# Altium schematic symbol library Diodes - TVS.SchLib: 5379 symbols (part 34 of 35) (continued)
## VESD01-02V-G-08 (continued)
TVS DIODE 1V 9V SOD523; Manufacturer: Vishay Semiconductor Diodes Division; Capacitance @ Frequency: 180pF @ 1MHz; Current - Peak Pulse (10/1000µs): 7A (8/20µs); Power Line Protection: No; Power - Peak Pulse: 63W; Type: Zener; Unidirectional Channels: 1; Voltage - Breakdown (Min): 1.5V; Voltage - Clamping (Max) @ Ipp: 9V (Typ); Voltage - Reverse Standoff (Typ): 1V (Max); Part Number: VESD01-02V-G-08; Applications: General Purpose; ComponentLink1Description: Datasheet; ComponentLink1URL: https://www.vishay.com/docs/83367/vesdxx02v.pdf; ComponentLink2Description: DigiKey Link; ComponentLink2URL: http://digikey.com/product-detail/en/vishay-semiconductor-diodes-division/VESD01-02V-G-08/VESD01-02V-G-08CT-ND/2658775; LastUpdated: 9/2/2020 1:28:24 AM; Lifecycle Status: Active; Minimum Order: 1; Mounting Type: Surface Mount; Operating Temperature: -40°C ~ 125°C (TJ); Package / Case: SC-79, SOD-523; Packaging: TapeAndReel; PartId: 9733; Part Status: Active; Price: 0.08; Series: -; Supplier 1: DigiKey; Supplier Part Number 1: VESD01-02V-G-08CT-ND; Supplier Device Package: SOD-523
footprint SOD523F
pins: 1, 2

## VESD01C1-02V-G3-08
designator D?
ESD PROTECTION DIODE SOD-523; Manufacturer: Vishay Semiconductor Diodes Division; Capacitance @ Frequency: 192pF @ 1MHz; Current - Peak Pulse (10/1000µs): 14.6A (8/20µs); Power Line Protection: No; Power - Peak Pulse: 100W; Type: Zener; Unidirectional Channels: 1; Voltage - Breakdown (Min): 2.5V; Voltage - Clamping (Max) @ Ipp: 6.9V; Voltage - Reverse Standoff (Typ): 1V (Max); Part Number: VESD01C1-02V-G3-08; Applications: Automotive; ComponentLink1Description: Datasheet; ComponentLink1URL: http://www.vishay.com/docs/86130/vesd01c1-02vtovesd33c1-02v.pdf; ComponentLink2Description: DigiKey Link; ComponentLink2URL: http://digikey.com/product-detail/en/vishay-semiconductor-diodes-division/VESD01C1-02V-G3-08/VESD01C1-02V-G3-08GICT-ND/9948014; LastUpdated: 9/2/2020 1:28:24 AM; Lifecycle Status: Active; Minimum Order: 1; Mounting Type: Surface Mount; Operating Temperature: -55°C ~ 150°C (TJ); Package / Case: SC-79, SOD-523; Packaging: TapeAndReel; PartId: 9729; Part Status: Active; Price: 0.06; Series: Automotive, AEC-Q101; Supplier 1: DigiKey; Supplier Part Number 1: VESD01C1-02V-G3-08GICT-ND; Supplier Device Package: SOD-523
footprint SOD523F
pins: 1, 2

## VESD01C1-02VHG3-08
designator D?
ESD PROTECTION DIODE SOD-523; Manufacturer: Vishay Semiconductor Diodes Division; Capacitance @ Frequency: 192pF @ 1MHz; Current - Peak Pulse (10/1000µs): 14.6A (8/20µs); Power Line Protection: No; Power - Peak Pulse: 100W; Type: Zener; Unidirectional Channels: 1; Voltage - Breakdown (Min): 2.5V; Voltage - Clamping (Max) @ Ipp: 6.9V; Voltage - Reverse Standoff (Typ): 1V (Max); Part Number: VESD01C1-02VHG3-08; Applications: Automotive; ComponentLink1Description: Datasheet; ComponentLink1URL: http://www.vishay.com/docs/86130/vesd01c1-02vtovesd33c1-02v.pdf; ComponentLink2Description: DigiKey Link; ComponentLink2URL: http://digikey.com/product-detail/en/vishay-semiconductor-diodes-division/VESD01C1-02VHG3-08/VESD01C1-02VHG3-08GICT-ND/9948024; LastUpdated: 9/2/2020 1:28:24 AM; Lifecycle Status: Active; Minimum Order: 1; Mounting Type: Surface Mount; Operating Temperature: -55°C ~ 150°C (TJ); Package / Case: SC-79, SOD-523; Packaging: TapeAndReel; PartId: 9736; Part Status: Active; Price: 0.06; Series: Automotive, AEC-Q101; Supplier 1: DigiKey; Supplier Part Number 1: VESD01C1-02VHG3-08GICT-ND; Supplier Device Package: SOD-523
footprint SOD523F
pins: 1, 2

## VESD03-02V-G-08
designator D?
TVS DIODE 3V 12V SOD523; Manufacturer: Vishay Semiconductor Diodes Division; Capacitance @ Frequency: 110pF @ 1MHz; Current - Peak Pulse (10/1000µs): 9A (8/20µs); Power Line Protection: No; Power - Peak Pulse: 108W; Type: Zener; Unidirectional Channels: 1; Voltage - Breakdown (Min): 4V; Voltage - Clamping (Max) @ Ipp: 12V (Typ); Voltage - Reverse Standoff (Typ): 3V (Max); Part Number: VESD03-02V-G-08; Applications: General Purpose; ComponentLink1Description: Datasheet; ComponentLink1URL: https://www.vishay.com/docs/83367/vesdxx02v.pdf; ComponentLink2Description: DigiKey Link; ComponentLink2URL: http://digikey.com/product-detail/en/vishay-semiconductor-diodes-division/VESD03-02V-G-08/VESD03-02V-G-08CT-ND/2658774; LastUpdated: 9/2/2020 1:28:24 AM; Lifecycle Status: Active; Minimum Order: 1; Mounting Type: Surface Mount; Operating Temperature: -40°C ~ 125°C (TJ); Package / Case: SC-79, SOD-523; Packaging: TapeAndReel; PartId: 9749; Part Status: Active; Price: 0.08; Series: -; Supplier 1: DigiKey; Supplier Part Number 1: VESD03-02V-G-08CT-ND; Supplier Device Package: SOD-523
footprint SOD523F
pins: 1, 2

## VESD03C1-02V-G3-08
designator D?
ESD PROTECTION DIODE SOD-523; Manufacturer: Vishay Semiconductor Diodes Division; Capacitance @ Frequency: 112pF @ 1MHz; Current - Peak Pulse (10/1000µs): 11.6A (8/20µs); Power Line Protection: No; Power - Peak Pulse: 100W; Type: Zener; Unidirectional Channels: 1; Voltage - Breakdown (Min): 4.4V; Voltage - Clamping (Max) @ Ipp: 8.7V; Voltage - Reverse Standoff (Typ): 3V (Max); Part Number: VESD03C1-02V-G3-08; Applications: Automotive; ComponentLink1Description: Datasheet; ComponentLink1URL: http://www.vishay.com/docs/86130/vesd01c1-02vtovesd33c1-02v.pdf; ComponentLink2Description: DigiKey Link; ComponentLink2URL: http://digikey.com/product-detail/en/vishay-semiconductor-diodes-division/VESD03C1-02V-G3-08/VESD03C1-02V-G3-08GICT-ND/9948015; LastUpdated: 9/2/2020 1:28:23 AM; Lifecycle Status: Active; Minimum Order: 1; Mounting Type: Surface Mount; Operating Temperature: -55°C ~ 150°C (TJ); Package / Case: SC-79, SOD-523; Packaging: TapeAndReel; PartId: 9725; Part Status: Active; Price: 0.06; Series: Automotive, AEC-Q101; Supplier 1: DigiKey; Supplier Part Number 1: VESD03C1-02V-G3-08GICT-ND; Supplier Device Package: SOD-523
footprint SOD523F
pins: 1, 2

## VESD03C1-02VHG3-08
designator D?
ESD PROTECTION DIODE SOD-523; Manufacturer: Vishay Semiconductor Diodes Division; Capacitance @ Frequency: 112pF @ 1MHz; Current - Peak Pulse (10/1000µs): 11.6A (8/20µs); Power Line Protection: No; Power - Peak Pulse: 100W; Type: Zener; Unidirectional Channels: 1; Voltage - Breakdown (Min): 4.4V; Voltage - Clamping (Max) @ Ipp: 8.7V; Voltage - Reverse Standoff (Typ): 3V (Max); Part Number: VESD03C1-02VHG3-08; Applications: Automotive; ComponentLink1Description: Datasheet; ComponentLink1URL: http://www.vishay.com/docs/86130/vesd01c1-02vtovesd33c1-02v.pdf; ComponentLink2Description: DigiKey Link; ComponentLink2URL: http://digikey.com/product-detail/en/vishay-semiconductor-diodes-division/VESD03C1-02VHG3-08/VESD03C1-02VHG3-08GICT-ND/9948025; LastUpdated: 9/2/2020 1:28:24 AM; Lifecycle Status: Active; Minimum Order: 1; Mounting Type: Surface Mount; Operating Temperature: -55°C ~ 150°C (TJ); Package / Case: SC-79, SOD-523; Packaging: TapeAndReel; PartId: 9800; Part Status: Active; Price: 0.06; Series: Automotive, AEC-Q101; Supplier 1: DigiKey; Supplier Part Number 1: VESD03C1-02VHG3-08GICT-ND; Supplier Device Package: SOD-523
footprint SOD523F
pins: 1, 2

## VESD05-02V-G-08
designator D?
TVS DIODE 5V 20V SOD523; Manufacturer: Vishay Semiconductor Diodes Division; Capacitance @ Frequency: 55pF @ 1MHz; Current - Peak Pulse (10/1000µs): 6A (8/20µs); Power Line Protection: No; Power - Peak Pulse: 120W; Type: Zener; Unidirectional Channels: 1; Voltage - Breakdown (Min): 6.5V; Voltage - Clamping (Max) @ Ipp: 20V (Typ); Voltage - Reverse Standoff (Typ): 5V (Max); Part Number: VESD05-02V-G-08; Applications: General Purpose; ComponentLink1Description: Datasheet; ComponentLink1URL: https://www.vishay.com/docs/83367/vesdxx02v.pdf; ComponentLink2Description: DigiKey Link; ComponentLink2URL: http://digikey.com/product-detail/en/vishay-semiconductor-diodes-division/VESD05-02V-G-08/VESD05-02V-G-08CT-ND/2658773; LastUpdated: 9/2/2020 1:28:24 AM; Lifecycle Status: Active; Minimum Order: 1; Mounting Type: Surface Mount; Operating Temperature: -40°C ~ 125°C (TJ); Package / Case: SC-79, SOD-523; Packaging: TapeAndReel; PartId: 9771; Part Status: Active; Price: 0.08; Series: -; Supplier 1: DigiKey; Supplier Part Number 1: VESD05-02V-G-08CT-ND; Supplier Device Package: SOD-523
footprint SOD523F
pins: 1, 2

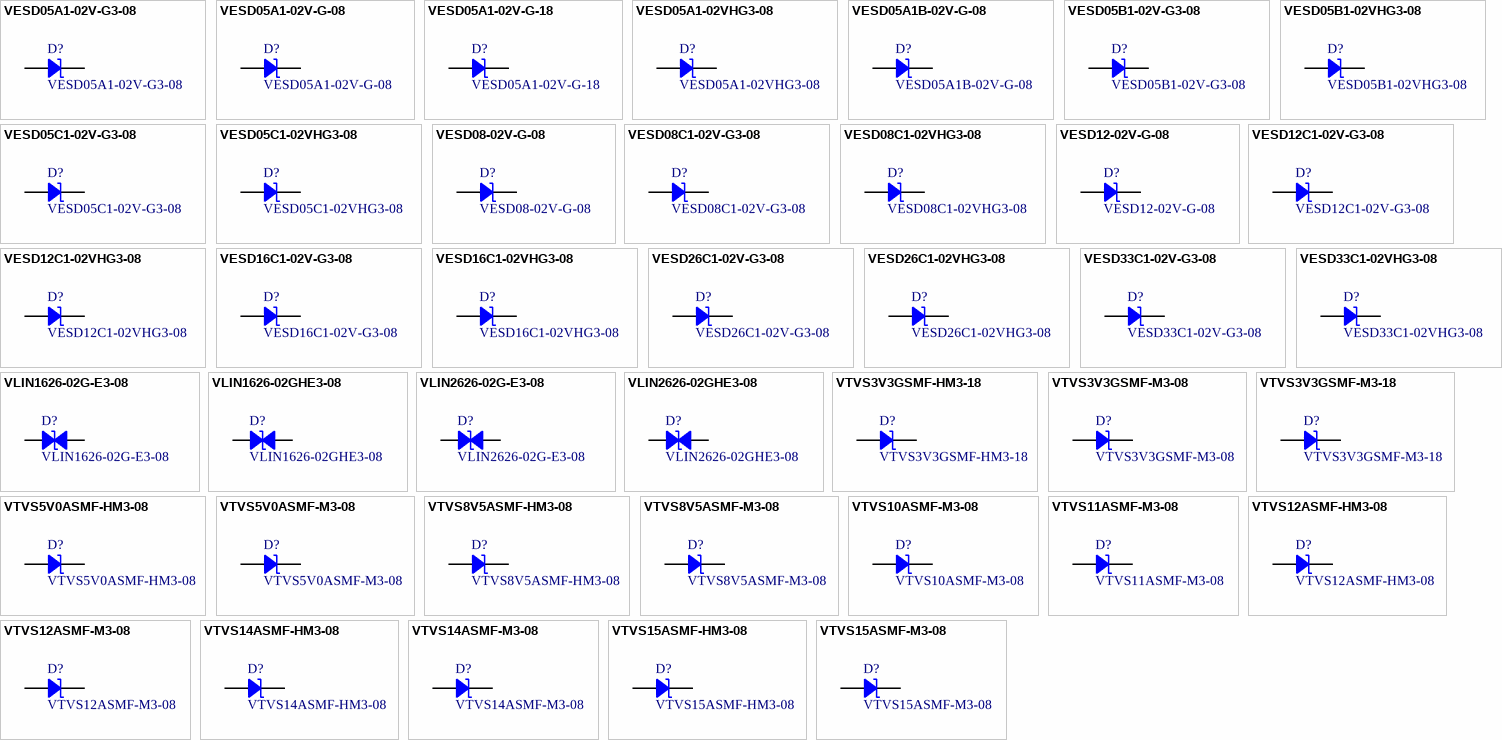
[diagram p133: symbols VESD05A1-02V-G3-08 to VTVS15ASMF-M3-08]

## VESD05A1-02V-G3-08
designator D?
ESD PROTECTION DIODE SOD-523; Manufacturer: Vishay Semiconductor Diodes Division; Capacitance @ Frequency: 130pF @ 1MHz; Current - Peak Pulse (10/1000µs): 16A (8/20µs); Power Line Protection: No; Power - Peak Pulse: 192W; Type: Zener; Unidirectional Channels: 1; Voltage - Breakdown (Min): 6V; Voltage - Clamping (Max) @ Ipp: 12V; Voltage - Reverse Standoff (Typ): 5V (Max); Part Number: VESD05A1-02V-G3-08; Applications: Automotive; ComponentLink1Description: Datasheet; ComponentLink1URL: http://www.vishay.com/docs/83369/vesd05a1.pdf; ComponentLink2Description: DigiKey Link; ComponentLink2URL: http://digikey.com/product-detail/en/vishay-semiconductor-diodes-division/VESD05A1-02V-G3-08/VESD05A1-02V-G3-08GICT-ND/9948022; LastUpdated: 9/2/2020 1:28:23 AM; Lifecycle Status: Active; Minimum Order: 1; Mounting Type: Surface Mount; Operating Temperature: -55°C ~ 150°C (TJ); Package / Case: SC-79, SOD-523; Packaging: TapeAndReel; PartId: 9721; Part Status: Active; Price: 0.06; Series: Automotive, AEC-Q101; Supplier 1: DigiKey; Supplier Part Number 1: VESD05A1-02V-G3-08GICT-ND; Supplier Device Package: SOD-523
footprint SOD523F
pins: 1, 2

## VESD05A1-02V-G-08
designator D?
TVS DIODE 5V 12V SOD523; Manufacturer: Vishay Semiconductor Diodes Division; Capacitance @ Frequency: 130pF @ 1MHz; Current - Peak Pulse (10/1000µs): 16A (8/20µs); Power Line Protection: No; Power - Peak Pulse: 192W; Type: Zener; Unidirectional Channels: 1; Voltage - Breakdown (Min): 6V; Voltage - Reverse Standoff (Typ): 5V (Max); Part Number: VESD05A1-02V-G-08; Applications: General Purpose; ComponentLink1Description: Datasheet; ComponentLink1URL: http://www.vishay.com/docs/83369/vesd05a1.pdf; ComponentLink2Description: DigiKey Link; ComponentLink2URL: http://digikey.com/product-detail/en/vishay-semiconductor-diodes-division/VESD05A1-02V-G-08/VESD05A1-02V-G-08CT-ND/2658779; LastUpdated: 9/2/2020 1:28:24 AM; Lifecycle Status: Active; Minimum Order: 1; Mounting Type: Surface Mount; Operating Temperature: -40°C ~ 125°C (TJ); Package / Case: SC-79, SOD-523; Packaging: TapeAndReel; PartId: 9747; Part Status: Active; Price: 0.08; Series: -; Supplier 1: DigiKey; Supplier Part Number 1: VESD05A1-02V-G-08CT-ND; Supplier Device Package: SOD-523; Voltage - Clamping (Max) @ Ipp: 12V
footprint SOD523F
pins: 1, 2

## VESD05A1-02V-G-18
designator D?
TVS DIODE 5V 12V SOD523; Manufacturer: Vishay Semiconductor Diodes Division; Capacitance @ Frequency: 130pF @ 1MHz; Current - Peak Pulse (10/1000µs): 16A (8/20µs); Power Line Protection: No; Power - Peak Pulse: 192W; Type: Zener; Unidirectional Channels: 1; Voltage - Breakdown (Min): 6V; Voltage - Reverse Standoff (Typ): 5V (Max); Part Number: VESD05A1-02V-G-18; Applications: General Purpose; ComponentLink1Description: Datasheet; ComponentLink1URL: http://www.vishay.com/docs/83369/vesd05a1.pdf; ComponentLink2Description: DigiKey Link; ComponentLink2URL: http://digikey.com/product-detail/en/vishay-semiconductor-diodes-division/VESD05A1-02V-G-18/VESD05A1-02V-G-18GICT-ND/9601398; LastUpdated: 9/2/2020 1:28:24 AM; Lifecycle Status: Active; Minimum Order: 1; Mounting Type: Surface Mount; Operating Temperature: -40°C ~ 125°C (TJ); Package / Case: SC-79, SOD-523; Packaging: TapeAndReel; PartId: 9741; Part Status: Active; Price: 0.07; Series: -; Supplier 1: DigiKey; Supplier Part Number 1: VESD05A1-02V-G-18GICT-ND; Supplier Device Package: SOD-523; Voltage - Clamping (Max) @ Ipp: 12V
footprint SOD523F
pins: 1, 2

## VESD05A1-02VHG3-08
designator D?
ESD PROTECTION DIODE SOD-523; Manufacturer: Vishay Semiconductor Diodes Division; Capacitance @ Frequency: 130pF @ 1MHz; Current - Peak Pulse (10/1000µs): 16A (8/20µs); Power Line Protection: No; Power - Peak Pulse: 192W; Type: Zener; Unidirectional Channels: 1; Voltage - Breakdown (Min): 6V; Voltage - Clamping (Max) @ Ipp: 12V; Voltage - Reverse Standoff (Typ): 5V (Max); Part Number: VESD05A1-02VHG3-08; Applications: Automotive; ComponentLink1Description: Datasheet; ComponentLink1URL: http://www.vishay.com/docs/83369/vesd05a1.pdf; ComponentLink2Description: DigiKey Link; ComponentLink2URL: http://digikey.com/product-detail/en/vishay-semiconductor-diodes-division/VESD05A1-02VHG3-08/VESD05A1-02VHG3-08GICT-ND/9948032; LastUpdated: 9/2/2020 1:28:24 AM; Lifecycle Status: Active; Minimum Order: 1; Mounting Type: Surface Mount; Operating Temperature: -55°C ~ 150°C (TJ); Package / Case: SC-79, SOD-523; Packaging: TapeAndReel; PartId: 9765; Part Status: Active; Price: 0.06; Series: Automotive, AEC-Q101; Supplier 1: DigiKey; Supplier Part Number 1: VESD05A1-02VHG3-08GICT-ND; Supplier Device Package: SOD-523
footprint SOD523F
pins: 1, 2

## VESD05A1B-02V-G-08
designator D?
TVS DIODE 5V 11V SOD523; Manufacturer: Vishay Semiconductor Diodes Division; Capacitance @ Frequency: 19pF @ 1MHz; Current - Peak Pulse (10/1000µs): 3A (8/20µs); Power Line Protection: No; Power - Peak Pulse: 33W; Type: Zener; Unidirectional Channels: 1; Voltage - Breakdown (Min): 6V; Voltage - Reverse Standoff (Typ): 5V (Max); Part Number: VESD05A1B-02V-G-08; Applications: General Purpose; ComponentLink1Description: Datasheet; ComponentLink1URL: http://www.vishay.com/docs/83368/vesd05a1.pdf; ComponentLink2Description: DigiKey Link; ComponentLink2URL: http://digikey.com/product-detail/en/vishay-semiconductor-diodes-division/VESD05A1B-02V-G-08/VESD05A1B-02V-G-08CT-ND/2658772; LastUpdated: 9/2/2020 1:28:24 AM; Lifecycle Status: Active; Minimum Order: 1; Mounting Type: Surface Mount; Operating Temperature: -40°C ~ 125°C (TJ); Package / Case: SC-79, SOD-523; Packaging: TapeAndReel; PartId: 9763; Part Status: Active; Price: 0.10; Series: -; Supplier 1: DigiKey; Supplier Part Number 1: VESD05A1B-02V-G-08CT-ND; Supplier Device Package: SOD-523; Voltage - Clamping (Max) @ Ipp: 11V
footprint SOD523F
pins: 1, 2

## VESD05B1-02V-G3-08
designator D?
ESD PROTECTION DIODE SOD-523; Manufacturer: Vishay Semiconductor Diodes Division; Capacitance @ Frequency: 23pF @ 1MHz; Current - Peak Pulse (10/1000µs): 3.5A (8/20µs); Power Line Protection: No; Power - Peak Pulse: 40W; Type: Zener; Unidirectional Channels: 1; Voltage - Breakdown (Min): 6V; Voltage - Clamping (Max) @ Ipp: 9.5V; Voltage - Reverse Standoff (Typ): 5V (Max); Part Number: VESD05B1-02V-G3-08; Applications: Automotive; ComponentLink1Description: Datasheet; ComponentLink1URL: http://www.vishay.com/docs/86124/vesd05b1-02v.pdf; ComponentLink2Description: DigiKey Link; ComponentLink2URL: http://digikey.com/product-detail/en/vishay-semiconductor-diodes-division/VESD05B1-02V-G3-08/VESD05B1-02V-G3-08GICT-ND/9948023; LastUpdated: 9/2/2020 1:28:23 AM; Lifecycle Status: Active; Minimum Order: 1; Mounting Type: Surface Mount; Operating Temperature: -55°C ~ 150°C (TJ); Package / Case: SC-79, SOD-523; Packaging: TapeAndReel; PartId: 9727; Part Status: Active; Price: 0.06; Series: Automotive, AEC-Q101; Supplier 1: DigiKey; Supplier Part Number 1: VESD05B1-02V-G3-08GICT-ND; Supplier Device Package: SOD-523
footprint SOD523F
pins: 1, 2

## VESD05B1-02VHG3-08
designator D?
ESD PROTECTION DIODE SOD-523; Manufacturer: Vishay Semiconductor Diodes Division; Capacitance @ Frequency: 23pF @ 1MHz; Current - Peak Pulse (10/1000µs): 3.5A (8/20µs); Power Line Protection: No; Power - Peak Pulse: 40W; Type: Zener; Unidirectional Channels: 1; Voltage - Breakdown (Min): 6V; Voltage - Clamping (Max) @ Ipp: 9.5V; Voltage - Reverse Standoff (Typ): 5V (Max); Part Number: VESD05B1-02VHG3-08; Applications: Automotive; ComponentLink1Description: Datasheet; ComponentLink1URL: http://www.vishay.com/docs/86124/vesd05b1-02v.pdf; ComponentLink2Description: DigiKey Link; ComponentLink2URL: http://digikey.com/product-detail/en/vishay-semiconductor-diodes-division/VESD05B1-02VHG3-08/VESD05B1-02VHG3-08GICT-ND/9948033; LastUpdated: 9/2/2020 1:28:23 AM; Lifecycle Status: Active; Minimum Order: 1; Mounting Type: Surface Mount; Operating Temperature: -55°C ~ 150°C (TJ); Package / Case: SC-79, SOD-523; Packaging: TapeAndReel; PartId: 9723; Part Status: Active; Price: 0.06; Series: Automotive, AEC-Q101; Supplier 1: DigiKey; Supplier Part Number 1: VESD05B1-02VHG3-08GICT-ND; Supplier Device Package: SOD-523
footprint SOD523F
pins: 1, 2

## VESD05C1-02V-G3-08
designator D?
ESD PROTECTION DIODE SOD-523; Manufacturer: Vishay Semiconductor Diodes Division; Capacitance @ Frequency: 67pF @ 1MHz; Current - Peak Pulse (10/1000µs): 8.7A (8/20µs); Power Line Protection: No; Power - Peak Pulse: 100W; Type: Zener; Unidirectional Channels: 1; Voltage - Breakdown (Min): 6.85V; Voltage - Clamping (Max) @ Ipp: 11.5V; Voltage - Reverse Standoff (Typ): 5V (Max); Part Number: VESD05C1-02V-G3-08; Applications: Automotive; ComponentLink1Description: Datasheet; ComponentLink1URL: http://www.vishay.com/docs/86130/vesd01c1-02vtovesd33c1-02v.pdf; ComponentLink2Description: DigiKey Link; ComponentLink2URL: http://digikey.com/product-detail/en/vishay-semiconductor-diodes-division/VESD05C1-02V-G3-08/VESD05C1-02V-G3-08GICT-ND/9948016; LastUpdated: 9/2/2020 1:28:24 AM; Lifecycle Status: Active; Minimum Order: 1; Mounting Type: Surface Mount; Operating Temperature: -55°C ~ 150°C (TJ); Package / Case: SC-79, SOD-523; Packaging: TapeAndReel; PartId: 9788; Part Status: Active; Price: 0.06; Series: Automotive, AEC-Q101; Supplier 1: DigiKey; Supplier Part Number 1: VESD05C1-02V-G3-08GICT-ND; Supplier Device Package: SOD-523
footprint SOD523F
pins: 1, 2

## VESD05C1-02VHG3-08
designator D?
ESD PROTECTION DIODE SOD-523; Manufacturer: Vishay Semiconductor Diodes Division; Capacitance @ Frequency: 67pF @ 1MHz; Current - Peak Pulse (10/1000µs): 8.7A (8/20µs); Power Line Protection: No; Power - Peak Pulse: 100W; Type: Zener; Unidirectional Channels: 1; Voltage - Breakdown (Min): 6.85V; Voltage - Clamping (Max) @ Ipp: 11.5V; Voltage - Reverse Standoff (Typ): 5V (Max); Part Number: VESD05C1-02VHG3-08; Applications: Automotive; ComponentLink1Description: Datasheet; ComponentLink1URL: http://www.vishay.com/docs/86130/vesd01c1-02vtovesd33c1-02v.pdf; ComponentLink2Description: DigiKey Link; ComponentLink2URL: http://digikey.com/product-detail/en/vishay-semiconductor-diodes-division/VESD05C1-02VHG3-08/VESD05C1-02VHG3-08GICT-ND/9948026; LastUpdated: 9/2/2020 1:28:24 AM; Lifecycle Status: Active; Minimum Order: 1; Mounting Type: Surface Mount; Operating Temperature: -55°C ~ 150°C (TJ); Package / Case: SC-79, SOD-523; Packaging: TapeAndReel; PartId: 9739; Part Status: Active; Price: 0.06; Series: Automotive, AEC-Q101; Supplier 1: DigiKey; Supplier Part Number 1: VESD05C1-02VHG3-08GICT-ND; Supplier Device Package: SOD-523
footprint SOD523F
pins: 1, 2

## VESD08-02V-G-08
designator D?
TVS DIODE 8V 30V SOD523; Manufacturer: Vishay Semiconductor Diodes Division; Capacitance @ Frequency: 35pF @ 1MHz; Current - Peak Pulse (10/1000µs): 4A (8/20µs); Power Line Protection: No; Power - Peak Pulse: 120W; Type: Zener; Unidirectional Channels: 1; Voltage - Breakdown (Min): 9V; Voltage - Clamping (Max) @ Ipp: 30V (Typ); Voltage - Reverse Standoff (Typ): 8V (Max); Part Number: VESD08-02V-G-08; Applications: General Purpose; ComponentLink1Description: Datasheet; ComponentLink1URL: https://www.vishay.com/docs/83367/vesdxx02v.pdf; ComponentLink2Description: DigiKey Link; ComponentLink2URL: http://digikey.com/product-detail/en/vishay-semiconductor-diodes-division/VESD08-02V-G-08/VESD08-02V-G-08CT-ND/2658771; LastUpdated: 9/2/2020 1:28:24 AM; Lifecycle Status: Active; Minimum Order: 1; Mounting Type: Surface Mount; Operating Temperature: -40°C ~ 125°C (TJ); Package / Case: SC-79, SOD-523; Packaging: TapeAndReel; PartId: 9734; Part Status: Active; Price: 0.08; Series: -; Supplier 1: DigiKey; Supplier Part Number 1: VESD08-02V-G-08CT-ND; Supplier Device Package: SOD-523
footprint SOD523F
pins: 1, 2

## VESD08C1-02V-G3-08
designator D?
ESD PROTECTION DIODE SOD-523; Manufacturer: Vishay Semiconductor Diodes Division; Capacitance @ Frequency: 47pF @ 1MHz; Current - Peak Pulse (10/1000µs): 6.6A (8/20µs); Power Line Protection: No; Power - Peak Pulse: 100W; Type: Zener; Unidirectional Channels: 1; Voltage - Breakdown (Min): 9.5V; Voltage - Clamping (Max) @ Ipp: 15.3V; Voltage - Reverse Standoff (Typ): 8V (Max); Part Number: VESD08C1-02V-G3-08; Applications: Automotive; ComponentLink1Description: Datasheet; ComponentLink1URL: http://www.vishay.com/docs/86130/vesd01c1-02vtovesd33c1-02v.pdf; ComponentLink2Description: DigiKey Link; ComponentLink2URL: http://digikey.com/product-detail/en/vishay-semiconductor-diodes-division/VESD08C1-02V-G3-08/VESD08C1-02V-G3-08GICT-ND/9948017; LastUpdated: 9/2/2020 1:28:24 AM; Lifecycle Status: Active; Minimum Order: 1; Mounting Type: Surface Mount; Operating Temperature: -55°C ~ 150°C (TJ); Package / Case: SC-79, SOD-523; Packaging: TapeAndReel; PartId: 9730; Part Status: Active; Price: 0.06; Series: Automotive, AEC-Q101; Supplier 1: DigiKey; Supplier Part Number 1: VESD08C1-02V-G3-08GICT-ND; Supplier Device Package: SOD-523
footprint SOD523F
pins: 1, 2

## VESD08C1-02VHG3-08
designator D?
ESD PROTECTION DIODE SOD-523; Manufacturer: Vishay Semiconductor Diodes Division; Capacitance @ Frequency: 47pF @ 1MHz; Current - Peak Pulse (10/1000µs): 6.6A (8/20µs); Power Line Protection: No; Power - Peak Pulse: 100W; Type: Zener; Unidirectional Channels: 1; Voltage - Breakdown (Min): 9.5V; Voltage - Clamping (Max) @ Ipp: 15.3V; Voltage - Reverse Standoff (Typ): 8V (Max); Part Number: VESD08C1-02VHG3-08; Applications: Automotive; ComponentLink1Description: Datasheet; ComponentLink1URL: http://www.vishay.com/docs/86130/vesd01c1-02vtovesd33c1-02v.pdf; ComponentLink2Description: DigiKey Link; ComponentLink2URL: http://digikey.com/product-detail/en/vishay-semiconductor-diodes-division/VESD08C1-02VHG3-08/VESD08C1-02VHG3-08GICT-ND/9948027; LastUpdated: 9/2/2020 1:28:24 AM; Lifecycle Status: Active; Minimum Order: 1; Mounting Type: Surface Mount; Operating Temperature: -55°C ~ 150°C (TJ); Package / Case: SC-79, SOD-523; Packaging: TapeAndReel; PartId: 9787; Part Status: Active; Price: 0.06; Series: Automotive, AEC-Q101; Supplier 1: DigiKey; Supplier Part Number 1: VESD08C1-02VHG3-08GICT-ND; Supplier Device Package: SOD-523
footprint SOD523F
pins: 1, 2

## VESD12-02V-G-08
designator D?
TVS DIODE 12V 25V SOD523; Manufacturer: Vishay Semiconductor Diodes Division; Capacitance @ Frequency: 30pF @ 1MHz; Current - Peak Pulse (10/1000µs): 2A (8/20µs); Power Line Protection: No; Power - Peak Pulse: 25W; Type: Zener; Unidirectional Channels: 1; Voltage - Breakdown (Min): 14V; Voltage - Clamping (Max) @ Ipp: 25V (Typ); Voltage - Reverse Standoff (Typ): 12V (Max); Part Number: VESD12-02V-G-08; Applications: General Purpose; ComponentLink1Description: Datasheet; ComponentLink1URL: https://www.vishay.com/docs/83367/vesdxx02v.pdf; ComponentLink2Description: DigiKey Link; ComponentLink2URL: http://digikey.com/product-detail/en/vishay-semiconductor-diodes-division/VESD12-02V-G-08/VESD12-02V-G-08CT-ND/2658778; LastUpdated: 9/2/2020 1:28:24 AM; Lifecycle Status: Active; Minimum Order: 1; Mounting Type: Surface Mount; Operating Temperature: -40°C ~ 125°C (TJ); Package / Case: SC-79, SOD-523; Packaging: TapeAndReel; PartId: 9748; Part Status: Active; Price: 0.08; Series: -; Supplier 1: DigiKey; Supplier Part Number 1: VESD12-02V-G-08CT-ND; Supplier Device Package: SOD-523
footprint SOD523F
pins: 1, 2

## VESD12C1-02V-G3-08
designator D?
ESD PROTECTION DIODE SOD-523; Manufacturer: Vishay Semiconductor Diodes Division; Capacitance @ Frequency: 33pF @ 1MHz; Current - Peak Pulse (10/1000µs): 4.4A (8/20µs); Power Line Protection: No; Power - Peak Pulse: 100W; Type: Zener; Unidirectional Channels: 1; Voltage - Breakdown (Min): 13.9V; Voltage - Clamping (Max) @ Ipp: 22.7V; Voltage - Reverse Standoff (Typ): 12V (Max); Part Number: VESD12C1-02V-G3-08; Applications: Automotive; ComponentLink1Description: Datasheet; ComponentLink1URL: http://www.vishay.com/docs/86130/vesd01c1-02vtovesd33c1-02v.pdf; ComponentLink2Description: DigiKey Link; ComponentLink2URL: http://digikey.com/product-detail/en/vishay-semiconductor-diodes-division/VESD12C1-02V-G3-08/VESD12C1-02V-G3-08GICT-ND/9948018; LastUpdated: 9/2/2020 1:28:24 AM; Lifecycle Status: Active; Minimum Order: 1; Mounting Type: Surface Mount; Operating Temperature: -55°C ~ 150°C (TJ); Package / Case: SC-79, SOD-523; Packaging: TapeAndReel; PartId: 9732; Part Status: Active; Price: 0.06; Series: Automotive, AEC-Q101; Supplier 1: DigiKey; Supplier Part Number 1: VESD12C1-02V-G3-08GICT-ND; Supplier Device Package: SOD-523
footprint SOD523F
pins: 1, 2

## VESD12C1-02VHG3-08
designator D?
ESD PROTECTION DIODE SOD-523; Manufacturer: Vishay Semiconductor Diodes Division; Capacitance @ Frequency: 33pF @ 1MHz; Current - Peak Pulse (10/1000µs): 4.4A (8/20µs); Power Line Protection: No; Power - Peak Pulse: 100W; Type: Zener; Unidirectional Channels: 1; Voltage - Breakdown (Min): 13.9V; Voltage - Clamping (Max) @ Ipp: 22.7V; Voltage - Reverse Standoff (Typ): 12V (Max); Part Number: VESD12C1-02VHG3-08; Applications: Automotive; ComponentLink1Description: Datasheet; ComponentLink1URL: http://www.vishay.com/docs/86130/vesd01c1-02vtovesd33c1-02v.pdf; ComponentLink2Description: DigiKey Link; ComponentLink2URL: http://digikey.com/product-detail/en/vishay-semiconductor-diodes-division/VESD12C1-02VHG3-08/VESD12C1-02VHG3-08GICT-ND/9948028; LastUpdated: 9/2/2020 1:28:24 AM; Lifecycle Status: Active; Minimum Order: 1; Mounting Type: Surface Mount; Operating Temperature: -55°C ~ 150°C (TJ); Package / Case: SC-79, SOD-523; Packaging: TapeAndReel; PartId: 9738; Part Status: Active; Price: 0.06; Series: Automotive, AEC-Q101; Supplier 1: DigiKey; Supplier Part Number 1: VESD12C1-02VHG3-08GICT-ND; Supplier Device Package: SOD-523
footprint SOD523F
pins: 1, 2

## VESD16C1-02V-G3-08
designator D?
ESD PROTECTION DIODE SOD-523; Manufacturer: Vishay Semiconductor Diodes Division; Capacitance @ Frequency: 27pF @ 1MHz; Current - Peak Pulse (10/1000µs): 3.6A (8/20µs); Power Line Protection: No; Power - Peak Pulse: 100W; Type: Zener; Unidirectional Channels: 1; Voltage - Breakdown (Min): 17V; Voltage - Clamping (Max) @ Ipp: 28V; Voltage - Reverse Standoff (Typ): 16V (Max); Part Number: VESD16C1-02V-G3-08; Applications: Automotive; ComponentLink1Description: Datasheet; ComponentLink1URL: http://www.vishay.com/docs/86130/vesd01c1-02vtovesd33c1-02v.pdf; ComponentLink2Description: DigiKey Link; ComponentLink2URL: http://digikey.com/product-detail/en/vishay-semiconductor-diodes-division/VESD16C1-02V-G3-08/VESD16C1-02V-G3-08GICT-ND/9948019; LastUpdated: 9/2/2020 1:28:24 AM; Lifecycle Status: Active; Minimum Order: 1; Mounting Type: Surface Mount; Operating Temperature: -55°C ~ 150°C (TJ); Package / Case: SC-79, SOD-523; Packaging: TapeAndReel; PartId: 9731; Part Status: Active; Price: 0.06; Series: Automotive, AEC-Q101; Supplier 1: DigiKey; Supplier Part Number 1: VESD16C1-02V-G3-08GICT-ND; Supplier Device Package: SOD-523
footprint SOD523F
pins: 1, 2

## VESD16C1-02VHG3-08
designator D?
ESD PROTECTION DIODE SOD-523; Manufacturer: Vishay Semiconductor Diodes Division; Capacitance @ Frequency: 27pF @ 1MHz; Current - Peak Pulse (10/1000µs): 3.6A (8/20µs); Power Line Protection: No; Power - Peak Pulse: 100W; Type: Zener; Unidirectional Channels: 1; Voltage - Breakdown (Min): 17V; Voltage - Clamping (Max) @ Ipp: 28V; Voltage - Reverse Standoff (Typ): 16V (Max); Part Number: VESD16C1-02VHG3-08; Applications: Automotive; ComponentLink1Description: Datasheet; ComponentLink1URL: http://www.vishay.com/docs/86130/vesd01c1-02vtovesd33c1-02v.pdf; ComponentLink2Description: DigiKey Link; ComponentLink2URL: http://digikey.com/product-detail/en/vishay-semiconductor-diodes-division/VESD16C1-02VHG3-08/VESD16C1-02VHG3-08GICT-ND/9948029; LastUpdated: 9/2/2020 1:28:24 AM; Lifecycle Status: Active; Minimum Order: 1; Mounting Type: Surface Mount; Operating Temperature: -55°C ~ 150°C (TJ); Package / Case: SC-79, SOD-523; Packaging: TapeAndReel; PartId: 9799; Part Status: Active; Price: 0.06; Series: Automotive, AEC-Q101; Supplier 1: DigiKey; Supplier Part Number 1: VESD16C1-02VHG3-08GICT-ND; Supplier Device Package: SOD-523
footprint SOD523F
pins: 1, 2

## VESD26C1-02V-G3-08
designator D?
ESD PROTECTION DIODE SOD-523; Manufacturer: Vishay Semiconductor Diodes Division; Capacitance @ Frequency: 17.5pF @ 1MHz; Current - Peak Pulse (10/1000µs): 2.1A (8/20µs); Power Line Protection: No; Power - Peak Pulse: 100W; Type: Zener; Unidirectional Channels: 1; Voltage - Breakdown (Min): 27.6V; Voltage - Clamping (Max) @ Ipp: 48V; Voltage - Reverse Standoff (Typ): 26V (Max); Part Number: VESD26C1-02V-G3-08; Applications: Automotive; ComponentLink1Description: Datasheet; ComponentLink1URL: http://www.vishay.com/docs/86130/vesd01c1-02vtovesd33c1-02v.pdf; ComponentLink2Description: DigiKey Link; ComponentLink2URL: http://digikey.com/product-detail/en/vishay-semiconductor-diodes-division/VESD26C1-02V-G3-08/VESD26C1-02V-G3-08GICT-ND/9948020; LastUpdated: 9/2/2020 1:28:23 AM; Lifecycle Status: Active; Minimum Order: 1; Mounting Type: Surface Mount; Operating Temperature: -55°C ~ 150°C (TJ); Package / Case: SC-79, SOD-523; Packaging: TapeAndReel; PartId: 9726; Part Status: Active; Price: 0.06; Series: Automotive, AEC-Q101; Supplier 1: DigiKey; Supplier Part Number 1: VESD26C1-02V-G3-08GICT-ND; Supplier Device Package: SOD-523
footprint SOD523F
pins: 1, 2

## VESD26C1-02VHG3-08
designator D?
ESD PROTECTION DIODE SOD-523; Manufacturer: Vishay Semiconductor Diodes Division; Capacitance @ Frequency: 17.5pF @ 1MHz; Current - Peak Pulse (10/1000µs): 2.1A (8/20µs); Power Line Protection: No; Power - Peak Pulse: 100W; Type: Zener; Unidirectional Channels: 1; Voltage - Breakdown (Min): 27.6V; Voltage - Clamping (Max) @ Ipp: 48V; Voltage - Reverse Standoff (Typ): 26V (Max); Part Number: VESD26C1-02VHG3-08; Applications: Automotive; ComponentLink1Description: Datasheet; ComponentLink1URL: http://www.vishay.com/docs/86130/vesd01c1-02vtovesd33c1-02v.pdf; ComponentLink2Description: DigiKey Link; ComponentLink2URL: http://digikey.com/product-detail/en/vishay-semiconductor-diodes-division/VESD26C1-02VHG3-08/VESD26C1-02VHG3-08GICT-ND/9948030; LastUpdated: 9/2/2020 1:28:24 AM; Lifecycle Status: Active; Minimum Order: 1; Mounting Type: Surface Mount; Operating Temperature: -55°C ~ 150°C (TJ); Package / Case: SC-79, SOD-523; Packaging: TapeAndReel; PartId: 9737; Part Status: Active; Price: 0.06; Series: Automotive, AEC-Q101; Supplier 1: DigiKey; Supplier Part Number 1: VESD26C1-02VHG3-08GICT-ND; Supplier Device Package: SOD-523
footprint SOD523F
pins: 1, 2

## VESD33C1-02V-G3-08
designator D?
ESD PROTECTION DIODE SOD-523; Manufacturer: Vishay Semiconductor Diodes Division; Capacitance @ Frequency: 15pF @ 1MHz; Current - Peak Pulse (10/1000µs): 1.6A (8/20µs); Power Line Protection: No; Power - Peak Pulse: 100W; Type: Zener; Unidirectional Channels: 1; Voltage - Breakdown (Min): 35.5V; Voltage - Clamping (Max) @ Ipp: 62.5V; Voltage - Reverse Standoff (Typ): 33V (Max); Part Number: VESD33C1-02V-G3-08; Applications: Automotive; ComponentLink1Description: Datasheet; ComponentLink1URL: http://www.vishay.com/docs/86130/vesd01c1-02vtovesd33c1-02v.pdf; ComponentLink2Description: DigiKey Link; ComponentLink2URL: http://digikey.com/product-detail/en/vishay-semiconductor-diodes-division/VESD33C1-02V-G3-08/VESD33C1-02V-G3-08GICT-ND/9948021; LastUpdated: 9/2/2020 1:28:24 AM; Lifecycle Status: Active; Minimum Order: 1; Mounting Type: Surface Mount; Operating Temperature: -55°C ~ 150°C (TJ); Package / Case: SC-79, SOD-523; Packaging: TapeAndReel; PartId: 9728; Part Status: Active; Price: 0.06; Series: Automotive, AEC-Q101; Supplier 1: DigiKey; Supplier Part Number 1: VESD33C1-02V-G3-08GICT-ND; Supplier Device Package: SOD-523
footprint SOD523F
pins: 1, 2

## VESD33C1-02VHG3-08
designator D?
ESD PROTECTION DIODE SOD-523; Manufacturer: Vishay Semiconductor Diodes Division; Capacitance @ Frequency: 15pF @ 1MHz; Current - Peak Pulse (10/1000µs): 1.6A (8/20µs); Power Line Protection: No; Power - Peak Pulse: 100W; Type: Zener; Unidirectional Channels: 1; Voltage - Breakdown (Min): 35.5V; Voltage - Clamping (Max) @ Ipp: 62.5V; Voltage - Reverse Standoff (Typ): 33V (Max); Part Number: VESD33C1-02VHG3-08; Applications: Automotive; ComponentLink1Description: Datasheet; ComponentLink1URL: http://www.vishay.com/docs/86130/vesd01c1-02vtovesd33c1-02v.pdf; ComponentLink2Description: DigiKey Link; ComponentLink2URL: http://digikey.com/product-detail/en/vishay-semiconductor-diodes-division/VESD33C1-02VHG3-08/VESD33C1-02VHG3-08GICT-ND/9948031; LastUpdated: 9/2/2020 1:28:24 AM; Lifecycle Status: Active; Minimum Order: 1; Mounting Type: Surface Mount; Operating Temperature: -55°C ~ 150°C (TJ); Package / Case: SC-79, SOD-523; Packaging: TapeAndReel; PartId: 9735; Part Status: Active; Price: 0.06; Series: Automotive, AEC-Q101; Supplier 1: DigiKey; Supplier Part Number 1: VESD33C1-02VHG3-08GICT-ND; Supplier Device Package: SOD-523
footprint SOD523F
pins: 1, 2

## VLIN1626-02G-E3-08
designator D?
TVS DIODE 16/26.5V 33/50V SOD323; Manufacturer: Vishay Semiconductor Diodes Division; Bidirectional Channels: 1; Capacitance @ Frequency: 15.5pF @ 1MHz; Current - Peak Pulse (10/1000µs): 6A (8/20µs), 4A (8/20µs); Power Line Protection: No; Power - Peak Pulse: 200W; Type: Zener; Voltage - Breakdown (Min): 17.1V, 28V; Voltage - Clamping (Max) @ Ipp: 33V, 50V; Voltage - Reverse Standoff (Typ): 16V (Max), 26.5V (Max); Part Number: VLIN1626-02G-E3-08; Applications: General Purpose; ComponentLink1Description: Datasheet; ComponentLink1URL: https://www.vishay.com/docs/85902/vlin1626-02g.pdf; ComponentLink2Description: DigiKey Link; ComponentLink2URL: http://digikey.com/product-detail/en/vishay-semiconductor-diodes-division/VLIN1626-02G-E3-08/VLIN1626-02G-E3-08GICT-ND/6021437; LastUpdated: 9/2/2020 1:28:29 AM; Lifecycle Status: Active; Minimum Order: 1; Mounting Type: Surface Mount; Operating Temperature: -55°C ~ 150°C (TJ); Package / Case: SC-76, SOD-323; Packaging: TapeAndReel; PartId: 9942; Part Status: Active; Price: 0.09; Series: -; Supplier 1: DigiKey; Supplier Part Number 1: VLIN1626-02G-E3-08GICT-ND; Supplier Device Package: SOD-323
footprint SOD323
pins: 1, 2

## VLIN1626-02GHE3-08
designator D?
TVS DIODE 16/26.5V 33/50V SOD323; Manufacturer: Vishay Semiconductor Diodes Division; Bidirectional Channels: 1; Capacitance @ Frequency: 15.5pF @ 1MHz; Current - Peak Pulse (10/1000µs): 6A (8/20µs), 4A (8/20µs); Power Line Protection: No; Power - Peak Pulse: 200W; Type: Zener; Voltage - Breakdown (Min): 17.1V, 28V; Voltage - Clamping (Max) @ Ipp: 33V, 50V; Voltage - Reverse Standoff (Typ): 16V (Max), 26.5V (Max); Part Number: VLIN1626-02GHE3-08; Applications: Automotive; ComponentLink1Description: Datasheet; ComponentLink1URL: http://www.vishay.com/docs/85902/vlin1626-02g.pdf; ComponentLink2Description: DigiKey Link; ComponentLink2URL: http://digikey.com/product-detail/en/vishay-semiconductor-diodes-division/VLIN1626-02GHE3-08/VLIN1626-02GHE3-08GICT-ND/8565407; LastUpdated: 9/2/2020 1:28:29 AM; Lifecycle Status: Active; Minimum Order: 1; Mounting Type: Surface Mount; Operating Temperature: -55°C ~ 150°C (TJ); Package / Case: SC-76, SOD-323; Packaging: TapeAndReel; PartId: 9958; Part Status: Active; Price: 0.10; Series: Automotive, AEC-Q101; Supplier 1: DigiKey; Supplier Part Number 1: VLIN1626-02GHE3-08GICT-ND; Supplier Device Package: SOD-323
footprint SOD323
pins: 1, 2

## VLIN2626-02G-E3-08
designator D?
TVS DIODE 26.5V 50V SOD323; Manufacturer: Vishay Semiconductor Diodes Division; Bidirectional Channels: 1; Capacitance @ Frequency: 13.5pF @ 1MHz; Current - Peak Pulse (10/1000µs): 4A (8/20µs); Power Line Protection: No; Power - Peak Pulse: 200W; Type: Zener; Voltage - Breakdown (Min): 28V; Voltage - Reverse Standoff (Typ): 26.5V (Max); Part Number: VLIN2626-02G-E3-08; Applications: General Purpose; ComponentLink1Description: Datasheet; ComponentLink1URL: https://www.vishay.com/docs/85915/vlin2626-02g.pdf; ComponentLink2Description: DigiKey Link; ComponentLink2URL: http://digikey.com/product-detail/en/vishay-semiconductor-diodes-division/VLIN2626-02G-E3-08/VLIN2626-02G-E3-08GICT-ND/6021438; LastUpdated: 9/2/2020 1:28:29 AM; Lifecycle Status: Active; Minimum Order: 1; Mounting Type: Surface Mount; Operating Temperature: -55°C ~ 150°C (TJ); Package / Case: SC-76, SOD-323; Packaging: TapeAndReel; PartId: 9979; Part Status: Active; Price: 0.10; Series: -; Supplier 1: DigiKey; Supplier Part Number 1: VLIN2626-02G-E3-08GICT-ND; Supplier Device Package: SOD-323; Voltage - Clamping (Max) @ Ipp: 50V
footprint SOD323
pins: 1, 2

## VLIN2626-02GHE3-08
designator D?
TVS DIODE 26.5V 50V SOD323; Manufacturer: Vishay Semiconductor Diodes Division; Bidirectional Channels: 1; Capacitance @ Frequency: 13.5pF @ 1MHz; Current - Peak Pulse (10/1000µs): 4A (8/20µs); Power Line Protection: No; Power - Peak Pulse: 200W; Type: Zener; Voltage - Breakdown (Min): 28V; Voltage - Reverse Standoff (Typ): 26.5V (Max); Part Number: VLIN2626-02GHE3-08; Applications: Automotive; ComponentLink1Description: Datasheet; ComponentLink1URL: https://www.vishay.com/docs/85915/vlin2626-02g.pdf; ComponentLink2Description: DigiKey Link; ComponentLink2URL: http://digikey.com/product-detail/en/vishay-semiconductor-diodes-division/VLIN2626-02GHE3-08/VLIN2626-02GHE3-08GICT-ND/8565408; LastUpdated: 9/2/2020 1:28:29 AM; Lifecycle Status: Active; Minimum Order: 1; Mounting Type: Surface Mount; Operating Temperature: -55°C ~ 150°C (TJ); Package / Case: SC-76, SOD-323; Packaging: TapeAndReel; PartId: 9959; Part Status: Active; Price: 0.10; Series: Automotive, AEC-Q101; Supplier 1: DigiKey; Supplier Part Number 1: VLIN2626-02GHE3-08GICT-ND; Supplier Device Package: SOD-323; Voltage - Clamping (Max) @ Ipp: 50V
footprint SOD323
pins: 1, 2